# Altium footprint library PcbLib_jp.PcbLib: 255 footprints (part 11 of 16)
Each footprint in its own frame and in the unit in brackets; x right, y up, seen from the top. Pads: shape width x height; smd on the part's side, far side on the other; paste and mask are expansions set on the pad; w line width, h text height; cw(c..) or ccw(c..) is an arc to the next point about the centre after c.
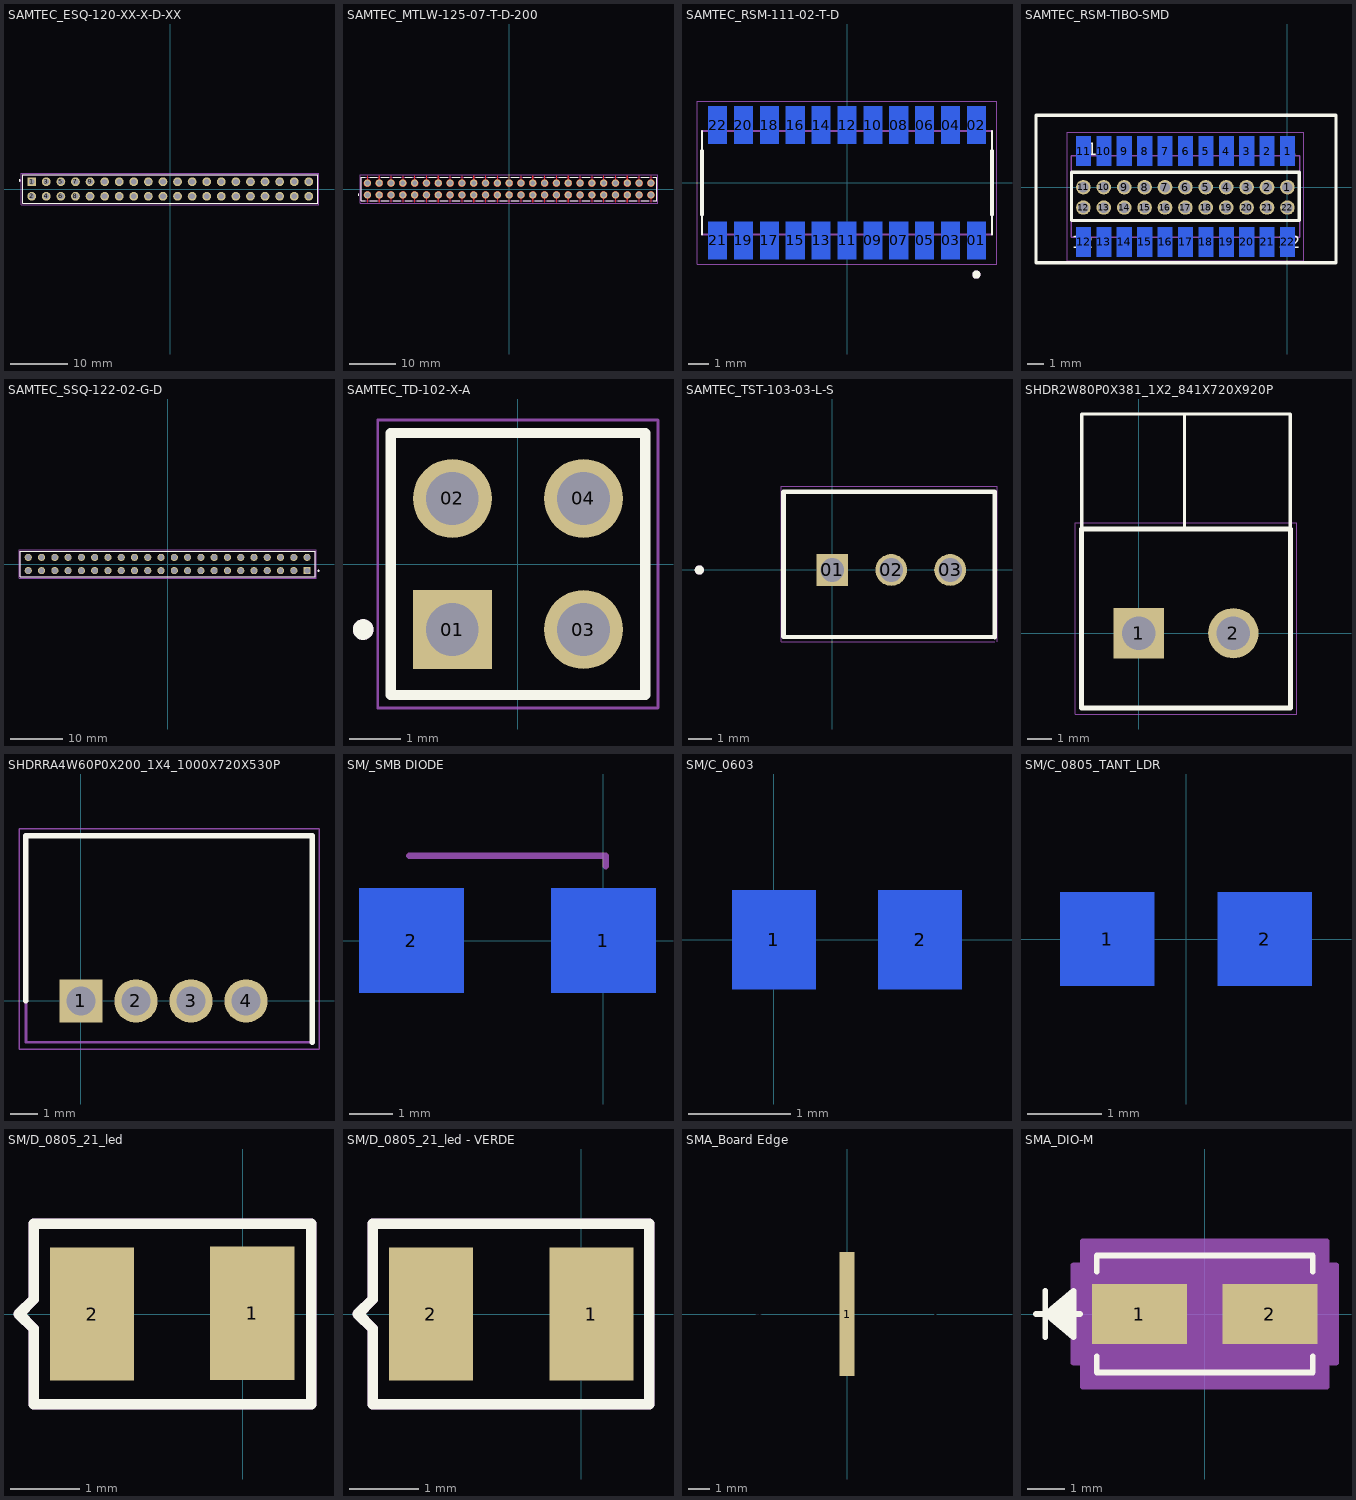
[diagram p10: the footprints below, top view; thin cyan lines are the x and y axes]

## SAMTEC_ESQ-120-XX-X-D-XX [mm]
height 13.84
pads (40):
  rect 1.53x1.53 hole 1.02: 1(-24.13,1.27)
  round 1.53 hole 1.02: 2(-24.13,-1.27) 3(-21.59,1.27) 4(-21.59,-1.27) 5(-19.05,1.27) 6(-19.05,-1.27) 7(-16.51,1.27) 8(-16.51,-1.27) 9(-13.97,1.27) 10(-13.97,-1.27) 11(-11.43,1.27) 12(-11.43,-1.27) 13(-8.89,1.27) 14(-8.89,-1.27) 15(-6.35,1.27) 16(-6.35,-1.27) 17(-3.81,1.27) 18(-3.81,-1.27) 19(-1.27,1.27) 20(-1.27,-1.27) 21(1.27,1.27) 22(1.27,-1.27) 23(3.81,1.27) 24(3.81,-1.27) 25(6.35,1.27) 26(6.35,-1.27) 27(8.89,1.27) 28(8.89,-1.27) 29(11.43,1.27) 30(11.43,-1.27) 31(13.97,1.27) 32(13.97,-1.27) 33(16.51,1.27) 34(16.51,-1.27) 35(19.05,1.27) 36(19.05,-1.27) 37(21.59,1.27) 38(21.59,-1.27) 39(24.13,1.27) 40(24.13,-1.27)
Top Overlay:
  circle w0.2: c-26.24,1.49 r0.1
  lines w0.2: -25.655,-2.475 -25.655,2.475 25.655,2.475 25.655,-2.475 -25.655,-2.475
Mechanical 13:
  circle w0.2: c-26.23,1.49 r0.1
  lines w0.1: -25.655,-2.475 -25.655,2.475 25.655,2.475 25.655,-2.475 -25.655,-2.475
Mechanical 15:
  lines w0.05: -25.905,-2.725 25.905,-2.725 25.905,2.725 -25.905,2.725 -25.905,-2.725
3D body "ESQ-120-14-T-D.step": height 10.51, standoff -12.73, extent -25.594,-2.7 25.714,2.38

## SAMTEC_MTLW-125-07-T-D-200 [mm]
pads (50):
  round 1.52 hole 1.02: 01(-30.48,-1.27) 02(-30.48,1.27) 03(-27.94,-1.27) 04(-27.94,1.27) 05(-25.4,-1.27) 06(-25.4,1.27) 07(-22.86,-1.27) 08(-22.86,1.27) 09(-20.32,-1.27) 10(-20.32,1.27) 11(-17.78,-1.27) 12(-17.78,1.27) 13(-15.24,-1.27) 14(-15.24,1.27) 15(-12.7,-1.27) 16(-12.7,1.27) 17(-10.16,-1.27) 18(-10.16,1.27) 19(-7.62,-1.27) 20(-7.62,1.27) 21(-5.08,-1.27) 22(-5.08,1.27) 23(-2.54,-1.27) 24(-2.54,1.27) 25(0,-1.27) 26(0,1.27) 27(2.54,-1.27) 28(2.54,1.27) 29(5.08,-1.27) 30(5.08,1.27) 31(7.62,-1.27) 32(7.62,1.27) 33(10.16,-1.27) 34(10.16,1.27) 35(12.7,-1.27) 36(12.7,1.27) 37(15.24,-1.27) 38(15.24,1.27) 39(17.78,-1.27) 40(17.78,1.27) 41(20.32,-1.27) 42(20.32,1.27) 43(22.86,-1.27) 44(22.86,1.27) 45(25.4,-1.27) 46(25.4,1.27) 47(27.94,-1.27) 48(27.94,1.27) 49(30.48,-1.27) 50(30.48,1.27)
Top Layer:
  drawing of 50 lines, arcs and shapes, not listed
Top Overlay:
  circle w0.2: c-32.4,-1.27 r0.1
  lines w0.2: -30.945,-2.515 -31.75,-2.515 -31.75,2.515 -30.945,2.515 ; -30.015,-2.515 -28.405,-2.515 ; -30.015,2.515 -28.405,2.515 ; -27.475,-2.515 -25.865,-2.515 ; -27.475,2.515 -25.865,2.515 ; -24.935,-2.515 -23.325,-2.515 ; -24.935,2.515 -23.325,2.515 ; -22.395,-2.515 -20.785,-2.515 ; -22.395,2.515 -20.785,2.515 ; -19.855,-2.515 -18.245,-2.515 ; -19.855,2.515 -18.245,2.515 ; -17.315,-2.515 -15.705,-2.515 ; -17.315,2.515 -15.705,2.515 ; -14.775,-2.515 -13.165,-2.515 ; -14.775,2.515 -13.165,2.515 ; -12.235,-2.515 -10.625,-2.515 ; -12.235,2.515 -10.625,2.515 ; -9.695,-2.515 -8.085,-2.515 ; -9.695,2.515 -8.085,2.515 ; -7.155,-2.515 -5.545,-2.515 ; -7.155,2.515 -5.545,2.515 ; -4.615,-2.515 -3.005,-2.515 ; -4.615,2.515 -3.005,2.515 ; -2.075,-2.515 -0.465,-2.515 ; -2.075,2.515 -0.465,2.515 ; 0.465,-2.515 2.075,-2.515 ; 0.465,2.515 2.075,2.515 ; 3.005,-2.515 4.615,-2.515 ; 3.005,2.515 4.615,2.515 ; 5.545,-2.515 7.155,-2.515 ; 5.545,2.515 7.155,2.515 ; 8.085,-2.515 9.695,-2.515 ; 8.085,2.515 9.695,2.515 ; 10.625,-2.515 12.235,-2.515 ; 10.625,2.515 12.235,2.515 ; 13.165,-2.515 14.775,-2.515 ; 13.165,2.515 14.775,2.515 ; 15.705,-2.515 17.315,-2.515 ; 15.705,2.515 17.315,2.515 ; 18.245,-2.515 19.855,-2.515 ; 18.245,2.515 19.855,2.515 ; 20.785,-2.515 22.395,-2.515 ; 20.785,2.515 22.395,2.515 ; 23.325,-2.515 24.935,-2.515 ; 23.325,2.515 24.935,2.515 ; 25.865,-2.515 27.475,-2.515 ; 25.865,2.515 27.475,2.515 ; 28.405,-2.515 30.015,-2.515 ; 28.405,2.515 30.015,2.515 ; 30.945,-2.515 31.75,-2.515 31.75,2.515 30.945,2.515
Top Paste:
  drawing of 50 lines, arcs and shapes, not listed
Top Solder:
  drawing of 50 lines, arcs and shapes, not listed
Mechanical 13:
  circle w0.2: c-32.4,-1.27 r0.1
  lines w0.1: -31.75,-2.515 -31.75,2.515 31.75,2.515 31.75,-2.515 -31.75,-2.515
Mechanical 15:
  lines w0.05: -32,-3.05 -32,3.05 32,3.05 32,-3.05 -32,-3.05
3D body "52k4541_7-534206-5.stp": height 8, standoff -3.56, extent -31.685,-2.415 31.815,2.614

## SAMTEC_RSM-111-02-T-D [mm]
pads (22):
  rect 0.91x1.84 smd far side: 01(6.35,-2.825) 02(6.35,2.825) 03(5.08,-2.825) 04(5.08,2.825) 05(3.81,-2.825) 06(3.81,2.825) 07(2.54,-2.825) 08(2.54,2.825) 09(1.27,-2.825) 10(1.27,2.825) 11(0,-2.825) 12(0,2.825) 13(-1.27,-2.825) 14(-1.27,2.825) 15(-2.54,-2.825) 16(-2.54,2.825) 17(-3.81,-2.825) 18(-3.81,2.825) 19(-5.08,-2.825) 20(-5.08,2.825) 21(-6.35,-2.825) 22(-6.35,2.825)
Top Overlay:
  circle w0.2: c6.35,-4.505 r0.1
  lines w0.1: -7.11,-2.54 -7.11,2.54 ; 7.11,-2.54 7.11,2.54
  lines w0.2: -7.11,-1.555 -7.11,1.555 ; 7.11,-1.555 7.11,1.555
Mechanical 13:
  circle w0.2: c6.35,-4.505 r0.1
  lines w0.1: -7.11,-2.54 7.11,-2.54 ; -7.11,2.54 7.11,2.54
Mechanical 15:
  lines w0.05: -7.36,-3.995 -7.36,3.995 7.36,3.995 7.36,-3.995 -7.36,-3.995

## SAMTEC_RSM-TIBO-SMD [mm]
pads (44):
  oval 0.914x0.889 hole 0.65: 1(0,0) 2(-1.27,0) 3(-2.54,0) 4(-3.81,0) 5(-5.08,0) 6(-6.35,0) 7(-7.62,0) 8(-8.89,0) 9(-10.16,0) 10(-11.43,0) 11(-12.7,0) 12(-12.7,-1.27) 13(-11.43,-1.27) 14(-10.16,-1.27) 15(-8.89,-1.27) 16(-7.62,-1.27) 17(-6.35,-1.27) 18(-5.08,-1.27) 19(-3.81,-1.27) 20(-2.54,-1.27) 21(-1.27,-1.27) 22(0,-1.27)
  rect 0.91x1.84 smd far side: 1(0.007,2.242) 2(-1.263,2.242) 3(-2.533,2.242) 4(-3.803,2.242) 5(-5.073,2.242) 6(-6.343,2.242) 7(-7.613,2.242) 8(-8.883,2.242) 9(-10.153,2.242) 10(-11.423,2.242) 11(-12.693,2.242) 12(-12.693,-3.408) 13(-11.423,-3.408) 14(-10.153,-3.408) 15(-8.883,-3.408) 16(-7.613,-3.408) 17(-6.343,-3.408) 18(-5.073,-3.408) 19(-3.803,-3.408) 20(-2.533,-3.408) 21(-1.263,-3.408) 22(0.007,-3.408)
Top Overlay:
  lines w0.2: -15.65,-4.7 3.025,-4.7 3.025,4.475 -15.65,4.475 -15.65,-4.475 -15.65,-4.7 ; -13.443,-2.075 -13.443,0.925 -13.155,0.925 0.732,0.925 0.732,-2.075 -13.106,-2.075 -13.443,-2.075
  text "1" at -0.075,1.975 h0.76
  text "11" at -13.175,1.975 h0.76
  text "12" at -13.425,-3.8 h0.76
  text "22" at -0.525,-3.8 h0.76
Mechanical 13:
  lines w0.1: -13.453,-3.123 0.767,-3.123 0.767,1.957 -13.453,1.957 -13.453,-3.123
Mechanical 15:
  lines w0.05: -13.703,-4.578 1.017,-4.578 1.017,3.412 -13.703,3.412 -13.703,-4.578
3D body "Tibbo Technology Inc-EM500.STEP": height 16.1, standoff -2.75, extent -15.45,-2.25 2.75,4.15

## SAMTEC_SSQ-122-02-G-D [mm]
pads (44):
  rect 1.37x1.37 hole 1.02: 01(26.67,-1.27)
  round 1.37 hole 1.02: 02(26.67,1.27) 03(24.13,-1.27) 04(24.13,1.27) 05(21.59,-1.27) 06(21.59,1.27) 07(19.05,-1.27) 08(19.05,1.27) 09(16.51,-1.27) 10(16.51,1.27) 11(13.97,-1.27) 12(13.97,1.27) 13(11.43,-1.27) 14(11.43,1.27) 15(8.89,-1.27) 16(8.89,1.27) 17(6.35,-1.27) 18(6.35,1.27) 19(3.81,-1.27) 20(3.81,1.27) 21(1.27,-1.27) 22(1.27,1.27) 23(-1.27,-1.27) 24(-1.27,1.27) 25(-3.81,-1.27) 26(-3.81,1.27) 27(-6.35,-1.27) 28(-6.35,1.27) 29(-8.89,-1.27) 30(-8.89,1.27) 31(-11.43,-1.27) 32(-11.43,1.27) 33(-13.97,-1.27) 34(-13.97,1.27) 35(-16.51,-1.27) 36(-16.51,1.27) 37(-19.05,-1.27) 38(-19.05,1.27) 39(-21.59,-1.27) 40(-21.59,1.27) 41(-24.13,-1.27) 42(-24.13,1.27) 43(-26.67,-1.27) 44(-26.67,1.27)
Top Overlay:
  circle w0.2: c28.845,-1.27 r0.1
  lines w0.2: -28.195,-2.475 28.195,-2.475 28.195,2.475 -28.195,2.475 -28.195,-2.475
Mechanical 13:
  circle w0.2: c28.845,-1.27 r0.1
  lines w0.1: -28.195,-2.475 -28.195,2.475 ; -28.195,-2.475 28.195,-2.475 ; -28.195,-2.475 -28.195,2.475 ; -28.195,2.475 28.195,2.475 ; -28.195,2.475 28.195,2.475 ; 28.195,-2.475 28.195,2.475 ; 28.195,-2.475 28.195,2.475
Mechanical 15:
  lines w0.05: -28.445,-2.725 28.445,-2.725 28.445,2.725 -28.445,2.725 -28.445,-2.725
3D body "76342322lf.stp": height 7, standoff -2.96, extent -28,-2.74 27.8,2.34

## SAMTEC_TD-102-X-A [mm]
pads (4):
  rect 1.53x1.53 hole 1.02 mask+0.05: 01(-1.27,-1.27)
  round 1.53 hole 1.02 mask+0.05: 02(-1.27,1.27) 03(1.27,-1.27) 04(1.27,1.27)
Top Overlay:
  circle w0.2: c-3,-1.27 r0.1
  lines w0.2: -2.464,-2.54 2.464,-2.54 2.464,2.54 -2.464,2.54 -2.464,-2.54
Mechanical 13:
  circle w0.2: c-3,-1.27 r0.1
  lines w0.1: -2.464,-2.54 2.464,-2.54 2.464,2.54 -2.464,2.54 -2.464,-2.54
Mechanical 15:
  lines w0.05: -2.714,-2.79 2.714,-2.79 2.714,2.79 -2.714,2.79 -2.714,-2.79
3D body "TD-102-X-A.step": height 8.28, standoff -3.84, extent -2.448,-2.38 2.48,2.7

## SAMTEC_TST-103-03-L-S [mm]
pads (3):
  rect 1.37x1.37 hole 1.02: 01(0,0)
  round 1.37 hole 1.02: 02(2.54,0) 03(5.08,0)
Top Overlay:
  circle w0.2: c-5.73,0 r0.1
  lines w0.2: -2.1,3.356 -2.1,-2.874 7,-2.9 7,3.365 -2.1,3.365
Mechanical 13:
  circle w0.2: c-5.73,0 r0.1
  lines w0.1: -2.1,-2.874 7,-2.9 7,3.365 -2.1,3.365 ; -2.1,3.356 7,3.3
Mechanical 15:
  lines w0.05: 7,-3.1 -2.2,-3.1 -2.2,3.615 7.1,3.615 7.1,-3.1
3D body "588581_640456-3.stp": height 9.49, standoff -4.1, extent -1.31,-2.711 6.31,3.131

## SHDR2W80P0X381_1X2_841X720X920P [mm]
pads (2):
  rect 2.025x2.025 / inner round 2.025 / far side rect 2.025x2.025 hole 1.35: 1(0,0)
  round 2.025 hole 1.35: 2(3.81,0)
Top Overlay:
  lines w0.127: -2.29,4.287 -2.29,8.82 6.1,8.82 6.1,4.287 ; 1.85,4.287 1.85,8.82
  lines w0.2: -2.3,-3 6.11,-3 6.11,4.2 -2.3,4.2 -2.3,-2.98
Mechanical 15:
  lines w0.1: -2.3,-3 6.11,-3 6.11,4.2 -2.3,4.2 -2.3,-3
Mechanical 20:
  lines w0.05: -2.55,-3.25 6.36,-3.25 6.36,4.45 -2.55,4.45 -2.55,-3.25
3D body "TBP02R2-381-02BE.stp": height 9.4, standoff -3.6, extent -2.285,-3.05 6.125,4.15

## SHDRRA4W60P0X200_1X4_1000X720X530P [mm]
pads (4):
  rect 1.575x1.575 hole 1.05: 1(0,0)
  round 1.575 hole 1.05: 2(2,0) 3(4,0) 4(6,0)
Top Overlay:
  lines w0.2: -2,0 -2,6 8.4,6 8.4,-1.5
Mechanical 13:
  lines w0.1: -2,-1.5 8.4,-1.5 8.4,6 -2,6 -2,-1.5
Mechanical 15:
  lines w0.05: -2.25,-1.75 -2.25,6.25 8.65,6.25 8.65,-1.75 -2.25,-1.75
3D body "DF3A-4P-2DS.stp": height 5.3, standoff -3.2, extent -1.84,-1.49 8.16,5.71

## SM/_SMB DIODE [mil]
pads (2):
  rect 96x96 smd far side: 1(0,0) 2(-176,0)
Bottom Overlay:
  lines w6: -125,75 -225,75 -225,-75 50,-75 ; -125,75 50,75 50,-75 ; -125,75 -125,-75 50,-75
Mechanical 2:
  lines w6: -178,78 2,78 2,68

## SM/C_0603 [mil]
height 137.8
pads (2):
  rect 32x38 smd far side: 1(0,0) 2(56,0)
Bottom Overlay:
  lines w6: -29.5,-32 -29.5,32.5 85.5,32.5 85.5,-32 -29.5,-32
3D body "CircuitWorks-RESISTOR 0603.STEP": height 3.15, standoff -16.93, extent -7.87,-16.92 55.12,16.93

## SM/C_0805_TANT_LDR [mil]
height 137.8
pads (2):
  rect 50x50 smd far side: 1(-42,0) 2(42,0)
Bottom Overlay:
  lines w6: -80,-37.5 80,-37.5 80,37.5 -80,37.5 -80,-37.5
  text "+" at -127,45 h56.25
3D body "User Library-Chip Cap_MLCC_0805 (2012)_B.STEP": height 23.62, standoff -7.87, extent -39.37,-25.59 39.37,23.62

## SM/D_0805_21_led [mil]
pads (2):
  rect 48x76 smd: 1(5.51,0.39) 2(-85.83,0)
Top Overlay:
  lines w6: -127.5,0 -119,8.5 -119,51.5 39,51.5 39,-51.5 -119,-51.5 -119,-8.5 -127.5,0
Mechanical 1:
  lines w6: -127.5,0 -119,8.5 -119,51.5 39,51.5 39,-51.5 -119,-51.5 -119,-8.5 -127.5,0
3D body "User Library-LED1206R.STEP": height 43.81, standoff -15.9, extent -103,-31 23,32

## SM/D_0805_21_led - VERDE [mil]
pads (2):
  rect 48x76 smd: 1(5.91,0) 2(-85.83,0)
Top Overlay:
  lines w6: -127.5,0 -119,-8.5 -119,-51.5 39,-51.5 39,51.5 -119,51.5 -119,8.5 -127.5,0
Mechanical 1:
  lines w6: -127.5,0 -119,-8.5 -119,-51.5 39,-51.5 39,51.5 -119,51.5 -119,8.5 -127.5,0
3D body "User Library-LED1206G.STEP": height 43.81, standoff -15.9, extent -102.37,-30.32 23.63,32.68

## SMA_Board Edge [mil]
pads (3):
  rect 27x225 smd: 1(0,0)
  rect 76x225 on Drill Drawing: 2(160,0) 3(-160,0)
3D body "User Library-142-0701-801.step": height 272, standoff -40, extent -187.49,-69.49 187.51,492.51

## SMA_DIO-M [mm]
pads (2):
  rect 2.561x1.63 smd paste+0 mask+0: 1(-1.768,0) 2(1.768,0)
Top Overlay:
  lines w0.152: -4.573,0 -3.382,0 ; -4.319,-0.635 -4.319,0.635 ; -3.557,-0.508 -4.319,0 ; -3.557,-0.381 -4.319,0 ; -3.557,-0.254 -4.319,0 ; -3.557,-0.127 -4.319,0 ; -3.557,0.127 -4.319,0 ; -3.557,0.254 -4.319,0 ; -3.557,0.381 -4.319,0 ; -3.557,0.508 -4.319,0 ; -2.922,-1.148 -2.922,-1.587 2.922,-1.587 2.922,-1.148 ; -2.922,1.148 -2.922,1.587 2.922,1.587 2.922,1.148 ; -4.319,0 -3.557,0.635 -3.557,-0.635 -4.319,0
Mechanical 13:
  lines w0.025: -4.573,0 -3.303,0 ; -4.319,-0.635 -4.319,0.635 ; -3.557,-0.508 -4.319,0 ; -3.557,-0.381 -4.319,0 ; -3.557,-0.254 -4.319,0 ; -3.557,-0.127 -4.319,0 ; -3.557,0.127 -4.319,0 ; -3.557,0.254 -4.319,0 ; -3.557,0.381 -4.319,0 ; -3.557,0.508 -4.319,0 ; -4.319,0 -3.557,0.635 -3.557,-0.635 -4.319,0 ; -2.795,-1.46 2.795,-1.46 2.795,1.46 -2.795,1.46 -2.795,-1.46
Mechanical 15:
  region: -3.303,-1.323 -3.557,-1.323 -3.557,1.323 -3.303,1.323 -3.303,1.968 3.303,1.968 3.303,1.323 3.557,1.323 3.557,-1.323 3.303,-1.323 3.303,-1.968 -3.303,-1.968
  lines w0.152: -3.557,-1.323 -3.557,1.323 -3.303,1.323 -3.303,1.968 3.303,1.968 3.303,1.323 3.557,1.323 3.557,-1.323 3.303,-1.323 3.303,-1.968 -3.303,-1.968 -3.303,-1.323 -3.557,-1.323
3D body "SMA_DIO.step": height 2.35, standoff 0, extent -2.795,-1.46 2.795,1.46